# Altium footprint library 430 integreted.PcbLib: 281 footprints (part 15 of 18)
Each footprint in its own frame and in the unit in brackets; x right, y up, seen from the top. Pads: shape width x height; smd on the part's side, far side on the other; paste and mask are expansions set on the pad; w line width, h text height; cw(c..) or ccw(c..) is an arc to the next point about the centre after c.
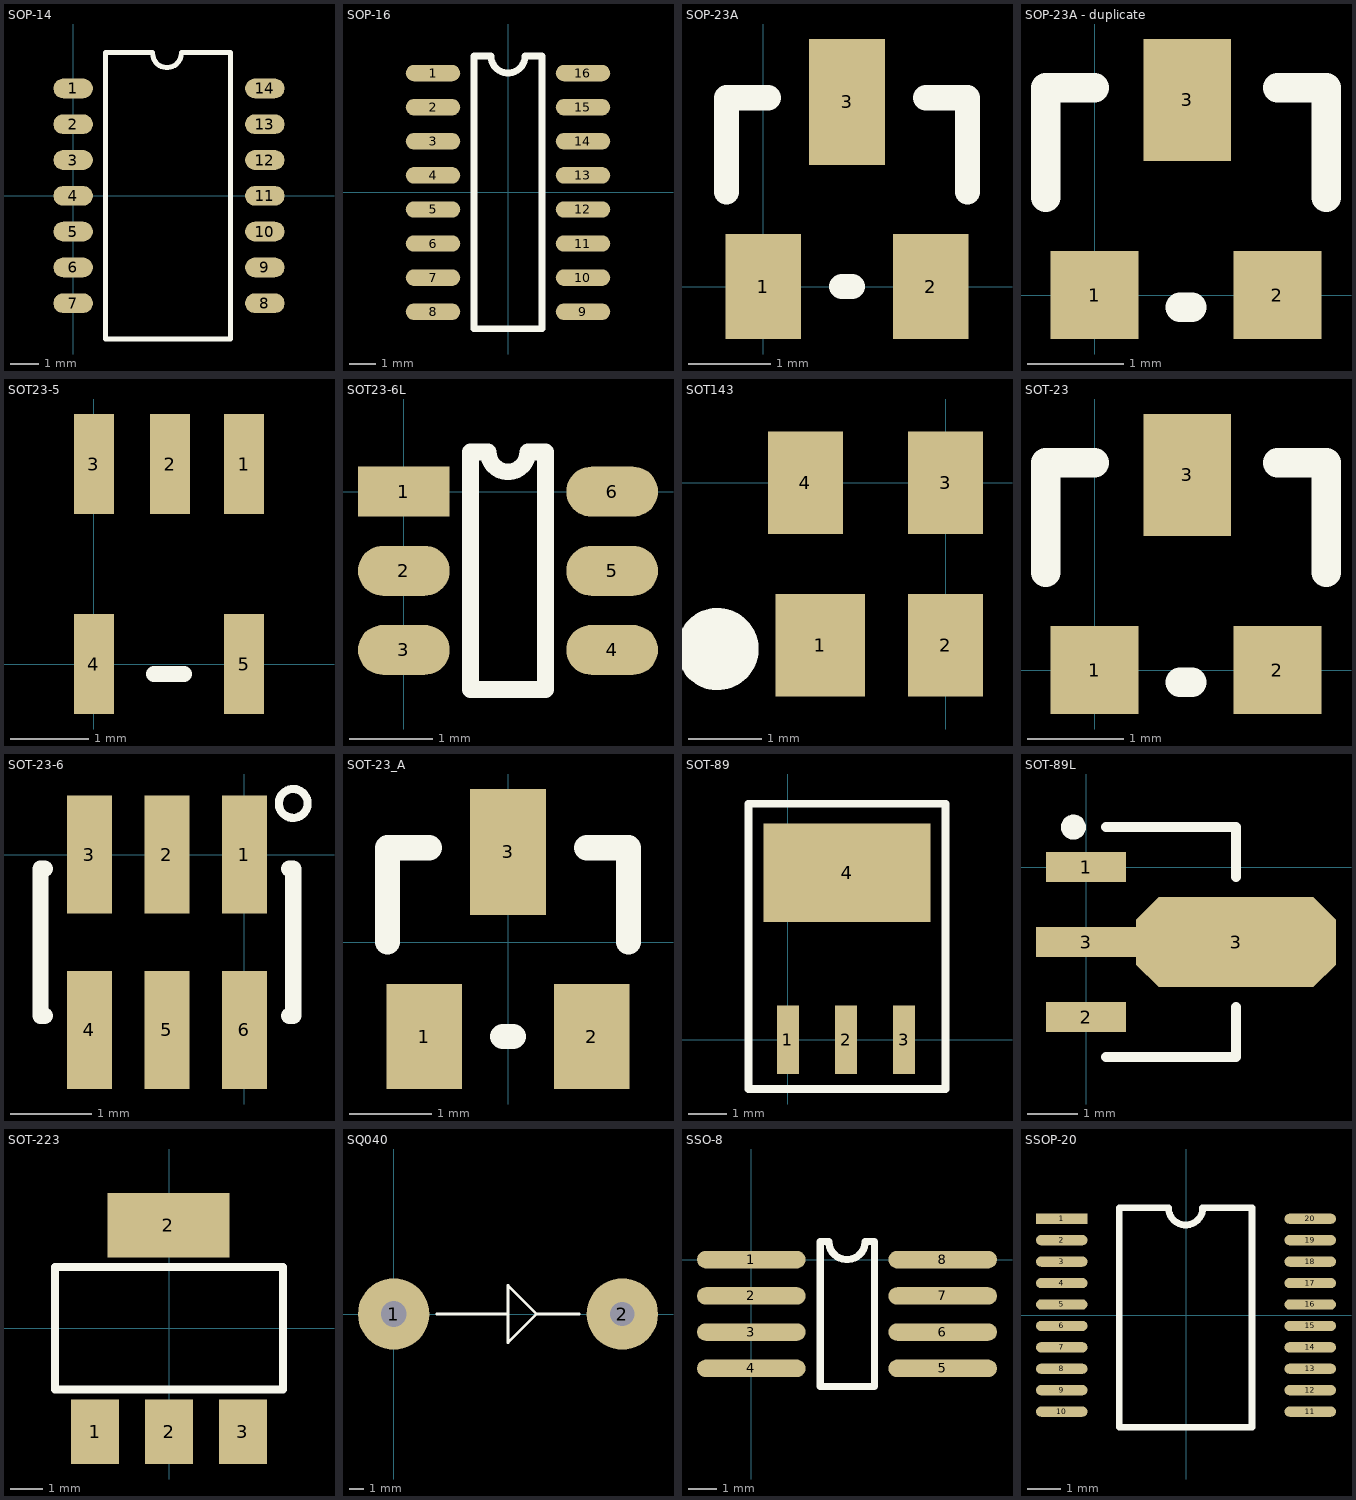
[diagram p14: the footprints below, top view; thin cyan lines are the x and y axes]

## SOP-14 [mm]
pads (14):
  oval 1.4x0.7 smd: 1(0,3.81) 2(0,2.54) 3(0,1.27) 4(0,0) 5(0,-1.27) 6(0,-2.54) 7(0,-3.81) 8(6.8,-3.81) 9(6.8,-2.54) 10(6.8,-1.27) 11(6.8,0) 12(6.8,1.27) 13(6.8,2.54) 14(6.8,3.81)
Top Overlay:
  lines w0.178: 2.819,5.055 ccw(c3.327,5.055) 3.835,5.055 ; 2.819,5.08 2.191,5.08 1.143,5.08 1.143,-5.08 5.588,-5.08 5.588,5.08 4.54,5.08 4.191,5.08 3.835,5.08
3D body: height 1.61, standoff 0, extent 0.278,-4.35 6.478,4.35

## SOP-16 [mil]
pads (16):
  oval 80x24 smd: 1(-110,175) 2(-110,125) 3(-110,75) 4(-110,25) 5(-110,-25) 6(-110,-75) 7(-110,-125) 8(-110,-175) 9(110,-175) 10(110,-125) 11(110,-75) 12(110,-25) 13(110,25) 14(110,75) 15(110,125) 16(110,175)
Top Overlay:
  lines w10: -50,-200 50,-200 50,200 25,200 cw(c0,200) -25,200 -50,200 -50,-200
3D body: height 57, standoff 0, extent -116.25,-195 116.25,198

## SOP-23A [mil]
pads (3):
  rect 36x50 smd: 1(0,0) 2(80,0)
  rect 36x60 smd: 3(40,88)
Top Overlay:
  lines w12: -17.5,45 -17.5,90 2.5,90 ; 37.5,0 42.5,0 ; 77.5,90 97.5,90 97.5,45

## SOP-23A - duplicate [mil]
pads (3):
  rect 36x36 smd: 1(0,0) 2(75,0)
  rect 36x50 smd: 3(38,80)
Top Overlay:
  lines w12: -20,40 -20,85 0,85 ; 35,-5 40,-5 ; 75,85 95,85 95,40

## SOT23-5 [mil]
pads (5):
  rect 20x50 smd: 1(75.04,100.04) 2(38.04,100.04) 3(0.04,100.04) 4(0.04,0.04) 5(75.04,0.04)
Top Overlay:
  lines w7.87: 30.04,-4.96 45.04,-4.96
3D body: height 42.79, standoff -0.51, extent -19.15,-5.12 95,105.12

## SOT23-6L [mm]
pads (6):
  rect 1.1x0.6 smd: 1(0,0)
  oval 1.1x0.6 smd: 2(0,-0.95) 3(0,-1.9) 4(2.5,-1.9) 5(2.5,-0.95) 6(2.5,0)
Top Overlay:
  lines w0.2: 1,0.475 0.8,0.475 0.8,-2.375 1.7,-2.375 1.7,0.475 1.5,0.475 ; 1.012,0.475 ccw(c1.25,0.475) 1.488,0.475

## SOT143 [mil]
pads (4):
  rect 48x55 smd: 1(-67,-87)
  rect 40x55 smd: 2(0,-87) 3(0,0) 4(-75,0)
Top Overlay:
  circle w22: c-122,-89 r11
3D body: height 31.5, standoff 0, extent -96.74,-80.2 22.54,-9

## SOT-23 [mil]
pads (3):
  rect 36x36 smd: 1(0,0) 2(75,0)
  rect 36x50 smd: 3(38,80)
Top Overlay:
  lines w12: -20,40 -20,85 0,85 ; 35,-5 40,-5 ; 75,85 95,85 95,40
3D body: height 47.24, standoff 0, extent -18.76,-11.65 95.42,98.59

## SOT-23-6 [mm]
pads (6):
  rect 0.55x1.45 smd: 1(0,0) 2(-0.95,0) 3(-1.9,0) 4(-1.9,-2.15) 5(-0.95,-2.15) 6(0,-2.15)
Top Overlay:
  circle w0.1: c0.599,0.627 r0.177
  lines w0.2: -2.45,-1.975 -2.5,-1.975 -2.5,-0.175 -2.45,-0.175 ; 0.55,-1.975 0.6,-1.975 0.6,-0.175 0.55,-0.175
3D body: height 1.08, standoff -0.01, extent -2.347,-2.269 0.447,0.157

## SOT-23_A [mil]
pads (3):
  rect 36x50 smd: 1(-40,-45) 2(40,-45)
  rect 36x60 smd: 3(0,43)
Top Overlay:
  lines w12: -57.5,0 -57.5,45 -37.5,45 ; -2.5,-45 2.5,-45 ; 37.5,45 57.5,45 57.5,0
3D body: height 47.24, standoff 0, extent -56.76,-57.65 57.42,52.59

## SOT-89 [mil]
pads (4):
  rect 22x70 smd: 1(0,0) 2(59,0) 3(118,0)
  rect 170x100 smd: 4(60,170)
Top Overlay:
  lines w8: -40,-50 160,-50 160,240 -40,240 -40,-50

## SOT-89L [mm] "SOT-89L"
pads (4):
  rect 1.6x0.6 smd: 1(0,0) 2(0,-3)
  rect 2x0.6 smd: 3(0,-1.5)
  oct 4x1.8 smd: 3(3,-1.5)
Top Overlay:
  circle w0.25: c-0.25,0.8 r0.125
  lines w0.2: 0.4,-3.8 3,-3.8 3,-2.8 ; 0.4,0.8 3,0.8 3,-0.2
Mechanical 13:
  lines w0.1: 0.4,-3.8 3,-3.8 ; 0.4,0.8 3,0.8

## SOT-223 [mil]
pads (4):
  rect 59x79 smd: 1(-90.55,-126.77) 2(0,-126.77) 3(90.55,-126.77)
  rect 150x79 smd: 2(-0.67,126.77)
Top Overlay:
  lines w10: -140,-74.77 140,-74.77 140,75.23 -140,75.23 -140,-74.77
3D body: height 66.93, standoff 0, extent -128.96,-135.49 126.95,138.53

## SQ040 [mm]
pads (2):
  round 5 hole 1.8: 1(0,0)
  round 5 hole 1.7: 2(16,0)
Top Overlay:
  lines w0.178: 3,0 8,0 ; 13,0 10,0 ; 8,0 8,-2 10,0 ; 8,0 8,2 10,0

## SSO-8 [mil]
pads (8):
  oval 150x24 smd: 1(0,0) 2(0,-50) 3(0,-100) 4(0,-150) 5(264,-150) 6(264,-100) 7(264,-50) 8(264,0)
Top Overlay:
  lines w10: 95,-175 170,-175 170,25 157,25 cw(c132,25) 107,25 95,25 95,-175

## SSOP-20 [mil]
pads (20):
  rect 60x12 smd: 1(-145,112.5)
  oval 60x12 smd: 2(-145,87.5) 3(-145,62.5) 4(-145,37.5) 5(-145,12.5) 6(-145,-12.5) 7(-145,-37.5) 8(-145,-62.5) 9(-145,-87.5) 10(-145,-112.5) 11(145,-112.5) 12(145,-87.5) 13(145,-62.5) 14(145,-37.5) 15(145,-12.5) 16(145,12.5) 17(145,37.5) 18(145,62.5) 19(145,87.5) 20(145,112.5)
Top Overlay:
  lines w7.87: -21,125.3 -77.76,125.3 -77.76,-130.61 76.97,-130.61 76.97,125.3 19,125.3 ; -20.39,125.3 ccw(c-0.39,125.3) 19.61,125.3
3D body: height 70.47, standoff -1.97, extent -155.51,-143.7 155.51,143.7